# Altium footprint library fszhang.PcbLib: 1032 footprints (part 64 of 66)
Each footprint in its own frame and in the unit in brackets; x right, y up, seen from the top. Pads: shape width x height; smd on the part's side, far side on the other; paste and mask are expansions set on the pad; w line width, h text height; cw(c..) or ccw(c..) is an arc to the next point about the centre after c.
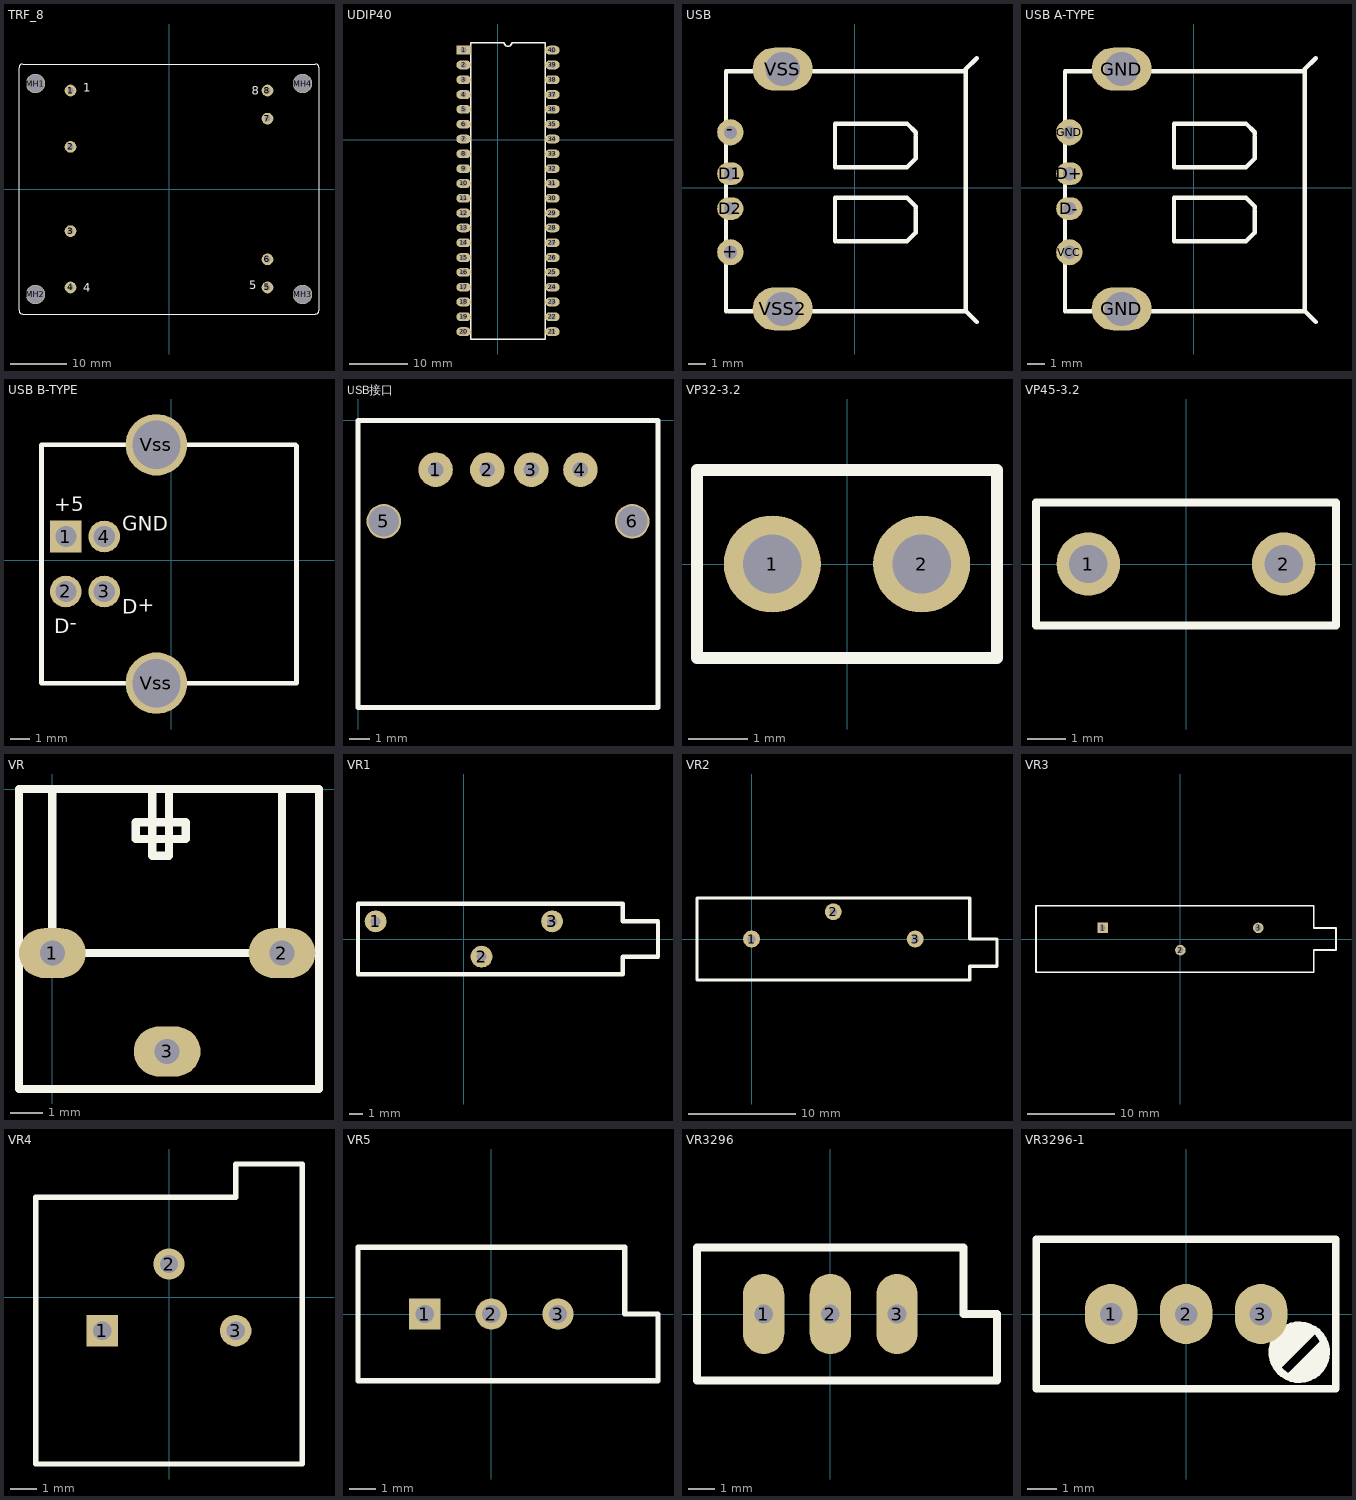
[diagram p63: the footprints below, top view; thin cyan lines are the x and y axes]

## TRF_8 [mil] "Buck-boost Transformer (Ideal); 8 Leads"
pads (12):
  round 82 hole 42: 1(-689.17,689.17) 2(-689.17,295) 3(-689.17,-295) 4(-689.17,-689.17) 5(689.17,-689.17) 6(689.17,-492.5) 7(689.17,492.5) 8(689.17,689.17)
  round 135 hole 125: MH1(-935,738.33) MH2(-935,-738.33) MH3(935,-738.33) MH4(935,738.33)
Top Overlay:
  lines w8: -1050,-850 ccw(c-1025,-850) -1025,-875 1025,-875 ccw(c1025,-850) 1050,-850 1050,850 ccw(c1025,850) 1025,875 -1025,875 ccw(c-1025,850) -1050,850 -1050,-850
  text "4" at -600,-720 h59.06
  text "8" at 580,660 h59.06
  text "5" at 560,-700 h59.06
  text "1" at -600,680 h59.06

## UDIP40 [mm]
pads (40):
  rect 2.5x1.5 hole 1: 1(-5.902,15.41)
  oval 2.5x1.5 hole 1: 2(-5.902,12.87) 3(-5.902,10.33) 4(-5.902,7.79) 5(-5.902,5.25) 6(-5.902,2.71) 7(-5.902,0.17) 8(-5.902,-2.37) 9(-5.902,-4.91) 10(-5.902,-7.45) 11(-5.902,-9.99) 12(-5.902,-12.53) 13(-5.902,-15.07) 14(-5.902,-17.61) 15(-5.902,-20.15) 16(-5.902,-22.69) 17(-5.902,-25.23) 18(-5.902,-27.77) 19(-5.902,-30.31) 20(-5.902,-32.85) 21(9.338,-32.85) 22(9.338,-30.31) 23(9.338,-27.77) 24(9.338,-25.23) 25(9.338,-22.69) 26(9.338,-20.15) 27(9.338,-17.61) 28(9.338,-15.07) 29(9.338,-12.53) 30(9.338,-9.99) 31(9.338,-7.45) 32(9.338,-4.91) 33(9.338,-2.37) 34(9.338,0.17) 35(9.338,2.71) 36(9.338,5.25) 37(9.338,7.79) 38(9.338,10.33) 39(9.338,12.87) 40(9.338,15.41)
Top Overlay:
  lines w0.254: -4.632,-34.12 -4.632,16.68 1.083,16.68 ccw(c1.718,16.68) 2.353,16.68 8.068,16.68 8.068,-34.12 -4.632,-34.12

## USB [mm]
pads (6):
  round 1.524 hole 0.762: +(-7.255,-3.757) -(-7.255,3.228)
  oval 1.524x1.324 hole 0.762: D1(-7.255,0.815) D2(-7.255,-1.217)
  oval 3.5x2.5 hole 2: VSS(-4.207,6.911) VSS2(-4.207,-7.059)
Top Overlay:
  lines w0.254: -7.509,-7.186 -7.509,6.784 6.461,6.784 ; -7.382,-7.186 6.461,-7.186 ; -1.159,-3.122 -1.159,-0.582 3.032,-0.582 3.54,-1.09 3.54,-1.217 ; -1.159,1.196 -1.159,3.736 3.032,3.736 3.54,3.228 3.54,3.101 ; -1.032,-3.122 3.032,-3.122 3.54,-2.614 3.54,-1.344 ; -1.032,1.196 3.032,1.196 3.54,1.704 3.54,2.974 ; 7.096,-7.821 6.461,-7.186 ; 7.096,7.546 6.461,6.911 6.461,6.784 ; 6.461,-7.186 6.461,6.784

## USB A-TYPE [mm]
pads (6):
  oval 1.524x1.324 hole 0.762: D+(-7.255,0.815) D-(-7.255,-1.217)
  round 1.524 hole 0.762: GND(-7.255,3.228) VCC(-7.255,-3.757)
  oval 3.5x2.5 hole 2: GND(-4.207,-7.059) GND(-4.207,6.911)
Top Overlay:
  lines w0.254: -7.509,-7.186 -7.509,6.784 6.461,6.784 ; -7.382,-7.186 6.461,-7.186 ; -1.159,-3.122 -1.159,-0.582 3.032,-0.582 3.54,-1.09 3.54,-1.217 ; -1.159,1.196 -1.159,3.736 3.032,3.736 3.54,3.228 3.54,3.101 ; -1.032,-3.122 3.032,-3.122 3.54,-2.614 3.54,-1.344 ; -1.032,1.196 3.032,1.196 3.54,1.704 3.54,2.974 ; 7.096,-7.821 6.461,-7.186 ; 7.096,7.546 6.461,6.911 6.461,6.784 ; 6.461,-7.186 6.461,6.784

## USB B-TYPE [mm]
pads (6):
  rect 1.651x1.651 hole 1.1: 1(-5.484,1.229)
  round 1.651 hole 1.1: 2(-5.484,-1.631) 3(-3.484,-1.631) 4(-3.484,1.229)
  round 3.2 hole 2.5: Vss(-0.774,-6.401) Vss(-0.774,5.999)
Top Overlay:
  lines w0.254: -6.756,-6.209 -6.756,5.791 ; -6.756,-5.893 -6.756,-6.401 6.516,-6.401 6.516,5.935 ; -6.756,5.283 -6.756,5.999 6.452,5.999 5.944,5.999
  text "D+" at -2.54,-2.032 h0.76
  text "+5" at -6.096,2.54 h0.76
  text "D-" at -6.096,-3.048 h0.76
  text "GND" at -2.54,1.524 h0.76

## USB接口 [mm]
pads (6):
  round 1.7 hole 0.762: 1(3.81,-2.413) 2(6.35,-2.413) 3(8.509,-2.413) 4(10.922,-2.413)
  round 1.7 hole 1.5: 5(1.27,-4.953) 6(13.462,-4.953)
Top Overlay:
  lines w0.254: 0,-14.097 0,0 14.732,0 14.732,-14.097 0,-14.097

## VP32-3.2 [mm] "Capacitor, Ceramic, Thru-Hole, Dipped Radial; Body 5.1 x 3.2 mm (WxT) Pin Spacing 2.54 mm (typ)"
height 6
pads (2):
  round 1.65 hole 1: 1(-1.27,0) 2(1.27,0)
Top Overlay:
  lines w0.2: -2.55,-1.6 -2.55,1.6 2.55,1.6 2.55,-1.6 -2.55,-1.6

## VP45-3.2 [mm] "Capacitor, Ceramic, Thru-Hole, Dipped Radial; Body 7.8 x 3.2 mm (WxT) Pin Spacing 5.08 mm (typ)"
height 6
pads (2):
  round 1.65 hole 1: 1(-2.54,0) 2(2.54,0)
Top Overlay:
  lines w0.2: -3.9,-1.6 -3.9,1.6 3.9,1.6 3.9,-1.6 -3.9,-1.6

## VR [mil]
pads (3):
  oval 80x60 hole 30: 1(0,-196.85) 2(275.59,-196.85) 3(137.8,-314.96)
Top Overlay:
  lines w10: 120,0 120,-80 140,-80 140,0 ; 0,0 -40,0 -40,-360 320,-360 320,-300 320,0 275.59,0 ; 0,0 0,-196.85 275.59,-196.85 275.59,0 ; 0,0 275.59,0 ; 100,-60 100,-40 160,-40 160,-60 100,-60

## VR1 [mil]
pads (3):
  round 62 hole 28: 1(-250,50) 2(50,-50) 3(250,50)
Top Overlay:
  lines w12: -300,-100 -300,100 450,100 450,50 550,50 550,-50 450,-50 450,-100 -300,-100

## VR2 [mil]
pads (3):
  round 62 hole 28: 1(0,0) 2(300,100) 3(600,0)
Top Overlay:
  lines w12: -200,-150 -200,150 800,150 800,0 900,0 900,-100 800,-100 800,-150 -200,-150

## VR3 [mm] "Tapped Resistor; 3 Leads"
pads (3):
  rect 1.2x1.2 hole 0.7: 1(-8.89,1.27)
  round 1.2 hole 0.7: 2(0,-1.27) 3(8.89,1.27)
Top Overlay:
  lines w0.2: -16.51,-3.81 15.24,-3.81 15.24,-1.27 17.78,-1.27 17.78,1.27 15.24,1.27 15.24,3.81 -16.51,3.81 -16.51,-3.81

## VR4 [mm] "Feed-Through Capacitor; 3 Leads"
pads (3):
  rect 1.2x1.2 hole 0.7: 1(-2.54,-1.27)
  round 1.2 hole 0.7: 2(0,1.27) 3(2.54,-1.27)
Top Overlay:
  lines w0.2: -5.08,-6.35 -5.08,3.81 2.54,3.81 2.54,5.08 5.08,5.08 5.08,-6.35 -5.08,-6.35

## VR5 [mm] "Potentiometer; 3 Leads"
pads (3):
  rect 1.2x1.2 hole 0.7: 1(-2.54,0)
  round 1.2 hole 0.7: 2(0,0) 3(2.54,0)
Top Overlay:
  lines w0.2: -5.08,-2.54 6.35,-2.54 6.35,0 5.08,0 5.08,2.54 -5.08,2.54 -5.08,-2.54

## VR3296 [mil]
pads (3):
  oval 62x120 hole 28: 1(-100,0) 2(0,0) 3(100,0)
Top Overlay:
  lines w12: -200,-100 -200,100 200,100 200,0 250,0 250,-100 -200,-100

## VR3296-1 [mil]
pads (3):
  oval 70x80 hole 30: 1(-100,0) 2(0,0) 3(100,0)
Top Overlay:
  circle w10: c151,-51 r36.06
  lines w10: 157.76,-74.24 164.24,-74.24 171,-81 ; 171,-21 151,-41 121,-71 121,-61 161,-21 141,-21 ; 172.88,-79.12 171,-81 ; 181,-41 141,-81 151,-81 ; 131,-31 121,-41 121,-51 141,-31 ; 131,-31 141,-21 ; 131,-31 141,-31 ; 141,-31 141,-21 ; 141,-31 151,-31 141,-21 ; 151,-81 171,-81 ; 151,-81 166.82,-65.18 172.88,-65.18 187.06,-51 187.06,-47.06 172.88,-61.23 170.77,-61.23 171,-61.47 171,-81 ; -200,-100 0,-100 200,-100 200,100 -200,100 -200,-100